# Altium footprint library 4.49-接插件.PcbLib: 260 footprints (part 16 of 17)
Each footprint in its own frame and in the unit in brackets; x right, y up, seen from the top. Pads: shape width x height; smd on the part's side, far side on the other; paste and mask are expansions set on the pad; w line width, h text height; cw(c..) or ccw(c..) is an arc to the next point about the centre after c.
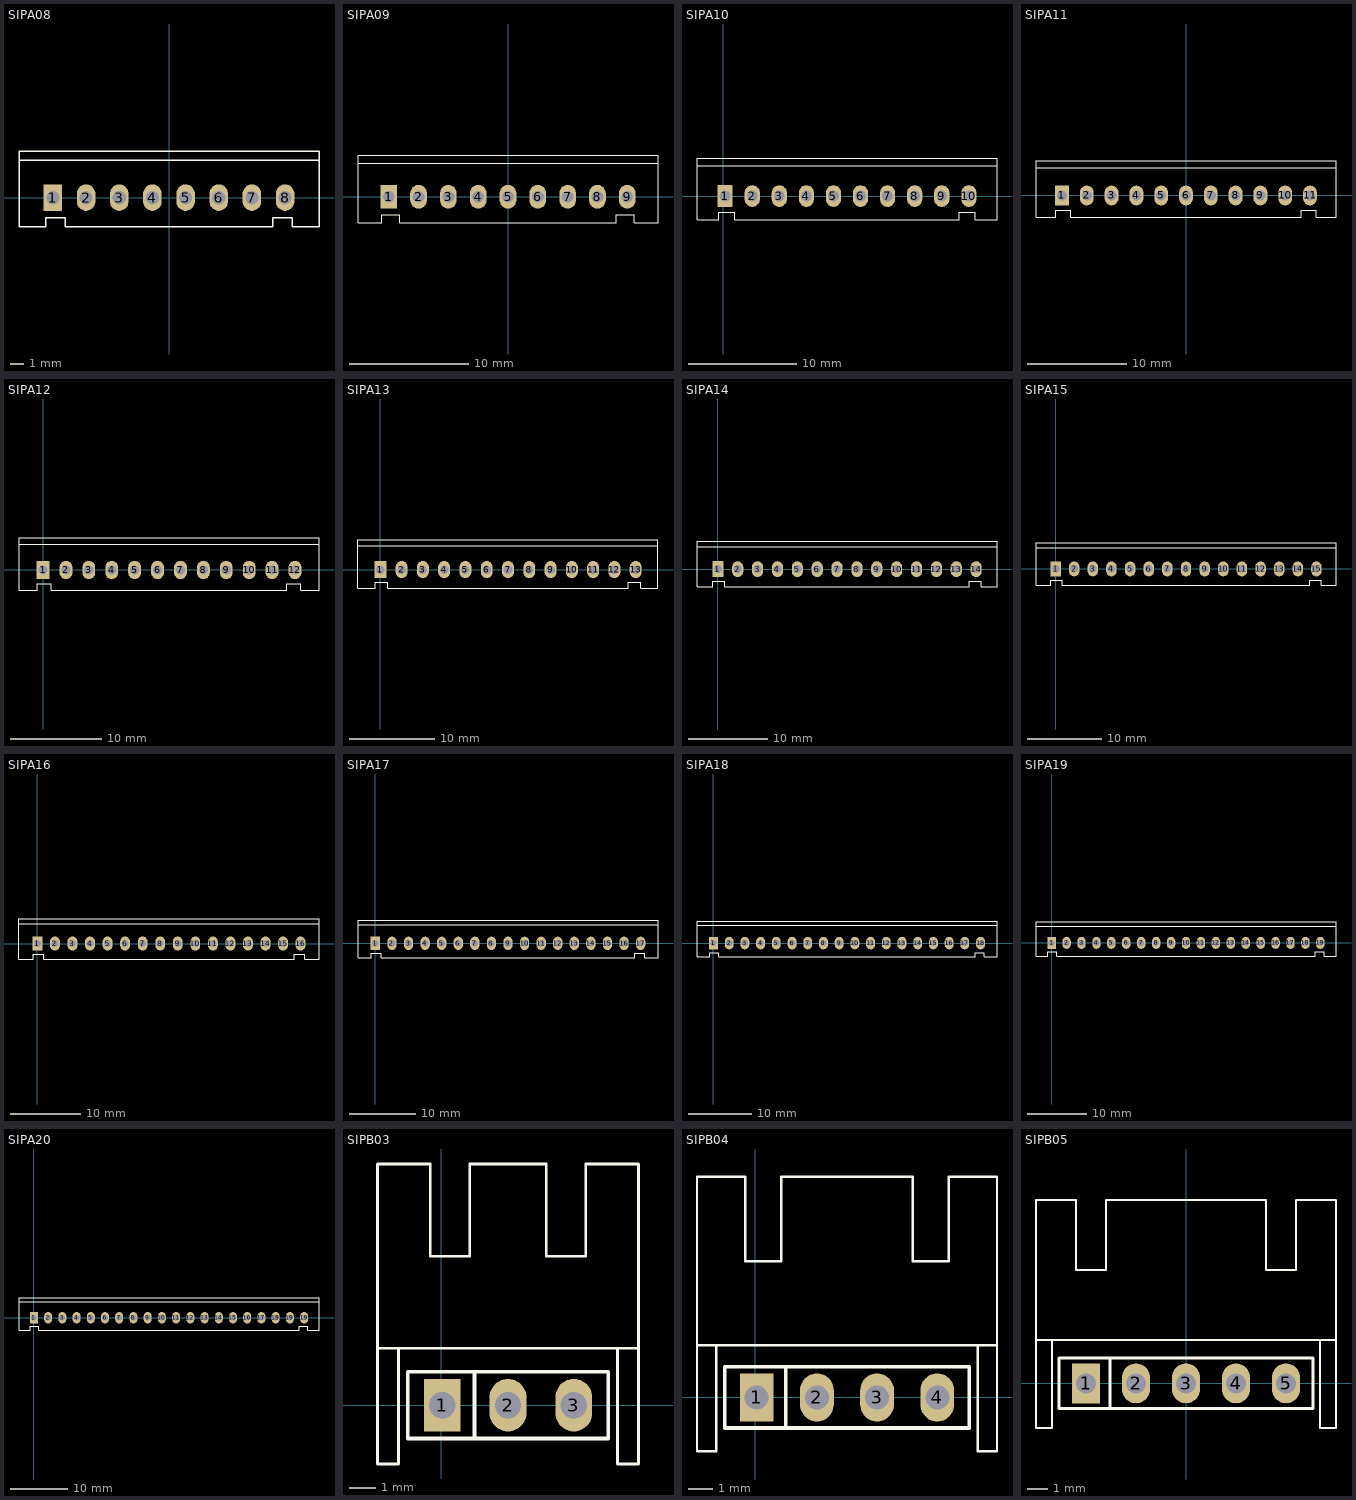
[diagram p15: the footprints below, top view; thin cyan lines are the x and y axes]

## SIPA08 [mm]
pads (8):
  rect 1.4x2 hole 1: 1(-8.75,0)
  oval 1.4x2 hole 1: 2(-6.25,0) 3(-3.75,0) 4(-1.25,0) 5(1.25,0) 6(3.75,0) 7(6.25,0) 8(8.75,0)
Top Overlay:
  lines w0.1: -11.31,2.8 11.298,2.8 ; -11.31,-2.2 -11.31,3.5 11.31,3.5 11.31,-2.2 9.31,-2.2 9.31,-1.5 7.81,-1.5 7.81,-2.2 -7.81,-2.2 -7.81,-1.5 -9.31,-1.5 -9.31,-2.2 -11.31,-2.2
3D body: height 7, standoff -3.5, extent -11.25,-2.25 11.25,3.45

## SIPA09 [mm]
pads (9):
  rect 1.4x2 hole 1: 1(-10,0)
  oval 1.4x2 hole 1: 2(-7.5,0) 3(-5,0) 4(-2.5,0) 5(0,0) 6(2.5,0) 7(5,0) 8(7.5,0) 9(10,0)
Top Overlay:
  lines w0.1: -12.58,2.8 12.571,2.8 ; -12.58,-2.2 -10.58,-2.2 -10.58,-1.5 -9.08,-1.5 -9.08,-2.2 9.08,-2.2 9.08,-1.5 10.58,-1.5 10.58,-2.2 12.58,-2.2 12.58,3.5 -12.58,3.5 -12.58,-2.2
3D body: height 7, standoff -3.5, extent -12.5,-2.25 12.5,3.45

## SIPA10 [mm]
pads (10):
  rect 1.4x2 hole 1: 1(0.18,0)
  oval 1.4x2 hole 1: 2(2.68,0) 3(5.18,0) 4(7.68,0) 5(10.18,0) 6(12.68,0) 7(15.18,0) 8(17.68,0) 9(20.18,0) 10(22.68,0)
Top Overlay:
  lines w0.1: -2.409,2.8 25.269,2.8 ; -2.42,-2.2 -2.42,3.5 25.28,3.5 25.28,-2.2 23.28,-2.2 23.28,-1.5 21.78,-1.5 21.78,-2.2 1.08,-2.2 1.08,-1.5 -0.42,-1.5 -0.42,-2.2 -2.42,-2.2
3D body: height 7, standoff -3.3, extent -2.37,-2.25 25.23,3.45

## SIPA11 [mm]
pads (11):
  rect 1.4x2 hole 1: 1(-12.5,0)
  oval 1.4x2 hole 1: 2(-10,0) 3(-7.5,0) 4(-5,0) 5(-2.5,0) 6(0,0) 7(2.5,0) 8(5,0) 9(7.5,0) 10(10,0) 11(12.5,0)
Top Overlay:
  lines w0.1: -15.109,2.8 15.12,2.8 ; -15.12,-2.2 -13.12,-2.2 -13.12,-1.5 -11.62,-1.5 -11.62,-2.2 11.62,-2.2 11.62,-1.5 13.12,-1.5 13.12,-2.2 15.12,-2.2 15.12,3.5 -15.12,3.5 -15.12,-2.2
3D body: height 7, standoff -3.3, extent -15.05,-2.25 15.05,3.45

## SIPA12 [mm]
pads (12):
  rect 1.4x2 hole 1: 1(0,0)
  oval 1.4x2 hole 1: 2(2.5,0) 3(5,0) 4(7.5,0) 5(10,0) 6(12.5,0) 7(15,0) 8(17.5,0) 9(20,0) 10(22.5,0) 11(25,0) 12(27.5,0)
Top Overlay:
  lines w0.1: -2.609,2.8 30.12,2.8 ; -2.62,-2.2 -2.62,3.5 30.12,3.5 30.12,-2.2 28.12,-2.2 28.12,-1.5 26.62,-1.5 26.62,-2.2 0.88,-2.2 0.88,-1.5 -0.62,-1.5 -0.62,-2.2 -2.62,-2.2
3D body: height 7, standoff -3.3, extent -2.55,-2.25 30.05,3.45

## SIPA13 [mm]
pads (13):
  rect 1.4x2 hole 1: 1(0,0)
  oval 1.4x2 hole 1: 2(2.5,0) 3(5,0) 4(7.5,0) 5(10,0) 6(12.5,0) 7(15,0) 8(17.5,0) 9(20,0) 10(22.5,0) 11(25,0) 12(27.5,0) 13(30,0)
Top Overlay:
  lines w0.1: -2.609,2.8 32.62,2.8 ; -2.62,-2.2 -0.62,-2.2 -0.62,-1.5 0.88,-1.5 0.88,-2.2 29.12,-2.2 29.12,-1.5 30.62,-1.5 30.62,-2.2 32.62,-2.2 32.62,3.5 -2.62,3.5 -2.62,-2.2
3D body: height 7, standoff -3.3, extent -2.55,-2.25 32.55,3.45

## SIPA14 [mm]
pads (14):
  rect 1.4x2 hole 1: 1(0,0)
  oval 1.4x2 hole 1: 2(2.5,0) 3(5,0) 4(7.5,0) 5(10,0) 6(12.5,0) 7(15,0) 8(17.5,0) 9(20,0) 10(22.5,0) 11(25,0) 12(27.5,0) 13(30,0) 14(32.5,0)
Top Overlay:
  lines w0.1: -2.609,2.8 35.12,2.8 ; -2.62,-2.2 -0.62,-2.2 -0.62,-1.5 0.88,-1.5 0.88,-2.2 31.62,-2.2 31.62,-1.5 33.12,-1.5 33.12,-2.2 35.12,-2.2 35.12,3.5 -2.62,3.5 -2.62,-2.2
3D body: height 7, standoff -3.3, extent -2.55,-2.25 35.05,3.45

## SIPA15 [mm]
pads (15):
  rect 1.4x2 hole 1: 1(0,0)
  oval 1.4x2 hole 1: 2(2.5,0) 3(5,0) 4(7.5,0) 5(10,0) 6(12.5,0) 7(15,0) 8(17.5,0) 9(20,0) 10(22.5,0) 11(25,0) 12(27.5,0) 13(30,0) 14(32.5,0) 15(35,0)
Top Overlay:
  lines w0.1: -2.609,2.8 37.62,2.8 ; -2.62,-2.2 -0.62,-2.2 -0.62,-1.5 0.88,-1.5 0.88,-2.2 34.12,-2.2 34.12,-1.5 35.62,-1.5 35.62,-2.2 37.62,-2.2 37.62,3.5 -2.62,3.5 -2.62,-2.2
3D body: height 7, standoff -3.3, extent -2.55,-2.25 37.55,3.45

## SIPA16 [mm]
pads (16):
  rect 1.4x2 hole 1: 1(0,0)
  oval 1.4x2 hole 1: 2(2.5,0) 3(5,0) 4(7.5,0) 5(10,0) 6(12.5,0) 7(15,0) 8(17.5,0) 9(20,0) 10(22.5,0) 11(25,0) 12(27.5,0) 13(30,0) 14(32.5,0) 15(35,0) 16(37.5,0)
Top Overlay:
  lines w0.1: -2.609,2.8 40.12,2.8 ; -2.62,-2.2 -0.62,-2.2 -0.62,-1.5 0.88,-1.5 0.88,-2.2 36.62,-2.2 36.62,-1.5 38.12,-1.5 38.12,-2.2 40.12,-2.2 40.12,3.5 -2.62,3.5 -2.62,-2.2
3D body: height 7, standoff -3.3, extent -2.55,-2.25 40.05,3.45

## SIPA17 [mm]
pads (17):
  rect 1.4x2 hole 1: 1(0,0)
  oval 1.4x2 hole 1: 2(2.5,0) 3(5,0) 4(7.5,0) 5(10,0) 6(12.5,0) 7(15,0) 8(17.5,0) 9(20,0) 10(22.5,0) 11(25,0) 12(27.5,0) 13(30,0) 14(32.5,0) 15(35,0) 16(37.5,0) 17(40,0)
Top Overlay:
  lines w0.1: -2.609,2.8 42.62,2.8 ; -2.62,-2.2 -2.62,3.5 42.62,3.5 42.62,-2.2 40.62,-2.2 40.62,-1.5 39.12,-1.5 39.12,-2.2 0.88,-2.2 0.88,-1.5 -0.62,-1.5 -0.62,-2.2 -2.62,-2.2
3D body: height 7, standoff -3.3, extent -2.55,-2.25 42.55,3.45

## SIPA18 [mm]
pads (18):
  rect 1.4x2 hole 1: 1(0,0)
  oval 1.4x2 hole 1: 2(2.5,0) 3(5,0) 4(7.5,0) 5(10,0) 6(12.5,0) 7(15,0) 8(17.5,0) 9(20,0) 10(22.5,0) 11(25,0) 12(27.5,0) 13(30,0) 14(32.5,0) 15(35,0) 16(37.5,0) 17(40,0) 18(42.5,0)
Top Overlay:
  lines w0.1: -2.609,2.8 45.12,2.8 ; -2.62,-2.2 -2.62,3.5 45.12,3.5 45.12,-2.2 43.12,-2.2 43.12,-1.5 41.62,-1.5 41.62,-2.2 0.88,-2.2 0.88,-1.5 -0.62,-1.5 -0.62,-2.2 -2.62,-2.2
3D body: height 7, standoff -3.3, extent -2.55,-2.25 45.05,3.45

## SIPA19 [mm]
pads (19):
  rect 1.4x2 hole 1: 1(0,0)
  oval 1.4x2 hole 1: 2(2.5,0) 3(5,0) 4(7.5,0) 5(10,0) 6(12.5,0) 7(15,0) 8(17.5,0) 9(20,0) 10(22.5,0) 11(25,0) 12(27.5,0) 13(30,0) 14(32.5,0) 15(35,0) 16(37.5,0) 17(40,0) 18(42.5,0) 19(45,0)
Top Overlay:
  lines w0.1: -2.609,2.8 47.62,2.8 ; -2.62,-2.2 -0.62,-2.2 -0.62,-1.5 0.88,-1.5 0.88,-2.2 44.12,-2.2 44.12,-1.5 45.62,-1.5 45.62,-2.2 47.62,-2.2 47.62,3.5 -2.62,3.5 -2.62,-2.2
3D body: height 7, standoff -3.3, extent -2.55,-2.25 47.55,3.45

## SIPA20 [mm]
pads (20):
  rect 1.4x2 hole 1: 1(0,0)
  oval 1.4x2 hole 1: 2(2.5,0) 3(5,0) 4(7.5,0) 5(10,0) 6(12.5,0) 7(15,0) 8(17.5,0) 9(20,0) 10(22.5,0) 11(25,0) 12(27.5,0) 13(30,0) 14(32.5,0) 15(35,0) 16(37.5,0) 17(40,0) 18(42.5,0) 19(45,0) 19(47.5,0)
Top Overlay:
  lines w0.1: -2.609,2.8 50.12,2.8 ; -2.62,-2.2 -2.62,3.5 50.12,3.5 50.12,-2.2 48.12,-2.2 48.12,-1.5 46.62,-1.5 46.62,-2.2 0.88,-2.2 0.88,-1.5 -0.62,-1.5 -0.62,-2.2 -2.62,-2.2
3D body: height 7, standoff -3.3, extent -2.55,-2.25 50.05,3.45

## SIPB03 [mm] "淘宝ID:黄晶宝石"
pads (3):
  rect 1.4x2 hole 1: 1(0.04,0)
  oval 1.4x2 hole 1: 2(2.54,0) 3(5.04,0)
Top Overlay:
  lines w0.1: 7.5,2.164 6.7,2.164 ; 6.7,2.164 -2.42,2.164 -1.62,2.164 -1.62,-2.236 -2.42,-2.236 -2.42,9.164 -0.42,9.164 -0.42,5.664 1.08,5.664 1.08,9.164 4,9.164 4,5.664 5.5,5.664 5.5,9.164 7.5,9.164 7.5,-2.236 6.7,-2.236 6.7,2.164
  lines w0.15: 1.27,-1.27 1.27,1.27 ; -1.27,-1.27 -1.27,1.27 6.35,1.27 6.35,-1.27 -1.27,-1.27
3D body: height 5.77, standoff -3.37, extent -2.413,-2.289 7.493,9.217

## SIPB04 [mm] "淘宝ID:黄晶宝石"
pads (4):
  rect 1.4x2 hole 1: 1(0.06,0)
  oval 1.4x2 hole 1: 2(2.56,0) 3(5.06,0) 4(7.56,0)
Top Overlay:
  lines w0.1: 1.08,9.164 1.08,5.664 -0.42,5.664 -0.42,9.164 -2.42,9.164 -2.42,-2.236 -1.62,-2.236 -1.62,2.164 -2.42,2.164 6.7,2.164 9.35,2.164 ; 1.08,9.167 6.54,9.167 ; 6.54,9.164 6.54,5.664 8.04,5.664 8.04,9.164 10.04,9.164 10.04,-2.236 9.24,-2.236 9.24,2.164 10.04,2.164
  lines w0.15: 1.27,-1.27 1.27,1.27 ; -1.27,-1.27 -1.27,1.27 8.89,1.27 8.89,-1.27 -1.27,-1.27
3D body: height 5.77, standoff -3.37, extent -2.388,-2.289 10.008,9.217

## SIPB05 [mm] "淘宝ID:黄晶宝石"
pads (5):
  rect 1.4x2 hole 1: 1(-5,0)
  oval 1.4x2 hole 1: 2(-2.5,0) 3(0,0) 4(2.5,0) 5(5,0)
Top Overlay:
  lines w0.1: -4,9.164 -4,5.664 -5.5,5.664 -5.5,9.164 -7.5,9.164 -7.5,-2.236 -6.7,-2.236 -6.7,2.164 -7.5,2.164 1.62,2.164 4.27,2.164 ; -4,9.167 4,9.167 ; 4,9.164 4,5.664 5.5,5.664 5.5,9.164 7.5,9.164 7.5,-2.236 6.7,-2.236 6.7,2.164 7.5,2.164 ; 4.16,2.164 6.81,2.164
  lines w0.15: -3.81,-1.27 -3.81,1.27 ; -6.35,-1.27 -6.35,1.27 6.35,1.27 6.35,-1.27 -6.35,-1.27
3D body: height 5.77, standoff -3.37, extent -7.455,-2.286 7.455,9.22